# Altium footprint library mastermind.PCBLIB: 1061 footprints (part 57 of 67)
Each footprint in its own frame and in the unit in brackets; x right, y up, seen from the top. Pads: shape width x height; smd on the part's side, far side on the other; paste and mask are expansions set on the pad; w line width, h text height; cw(c..) or ccw(c..) is an arc to the next point about the centre after c.
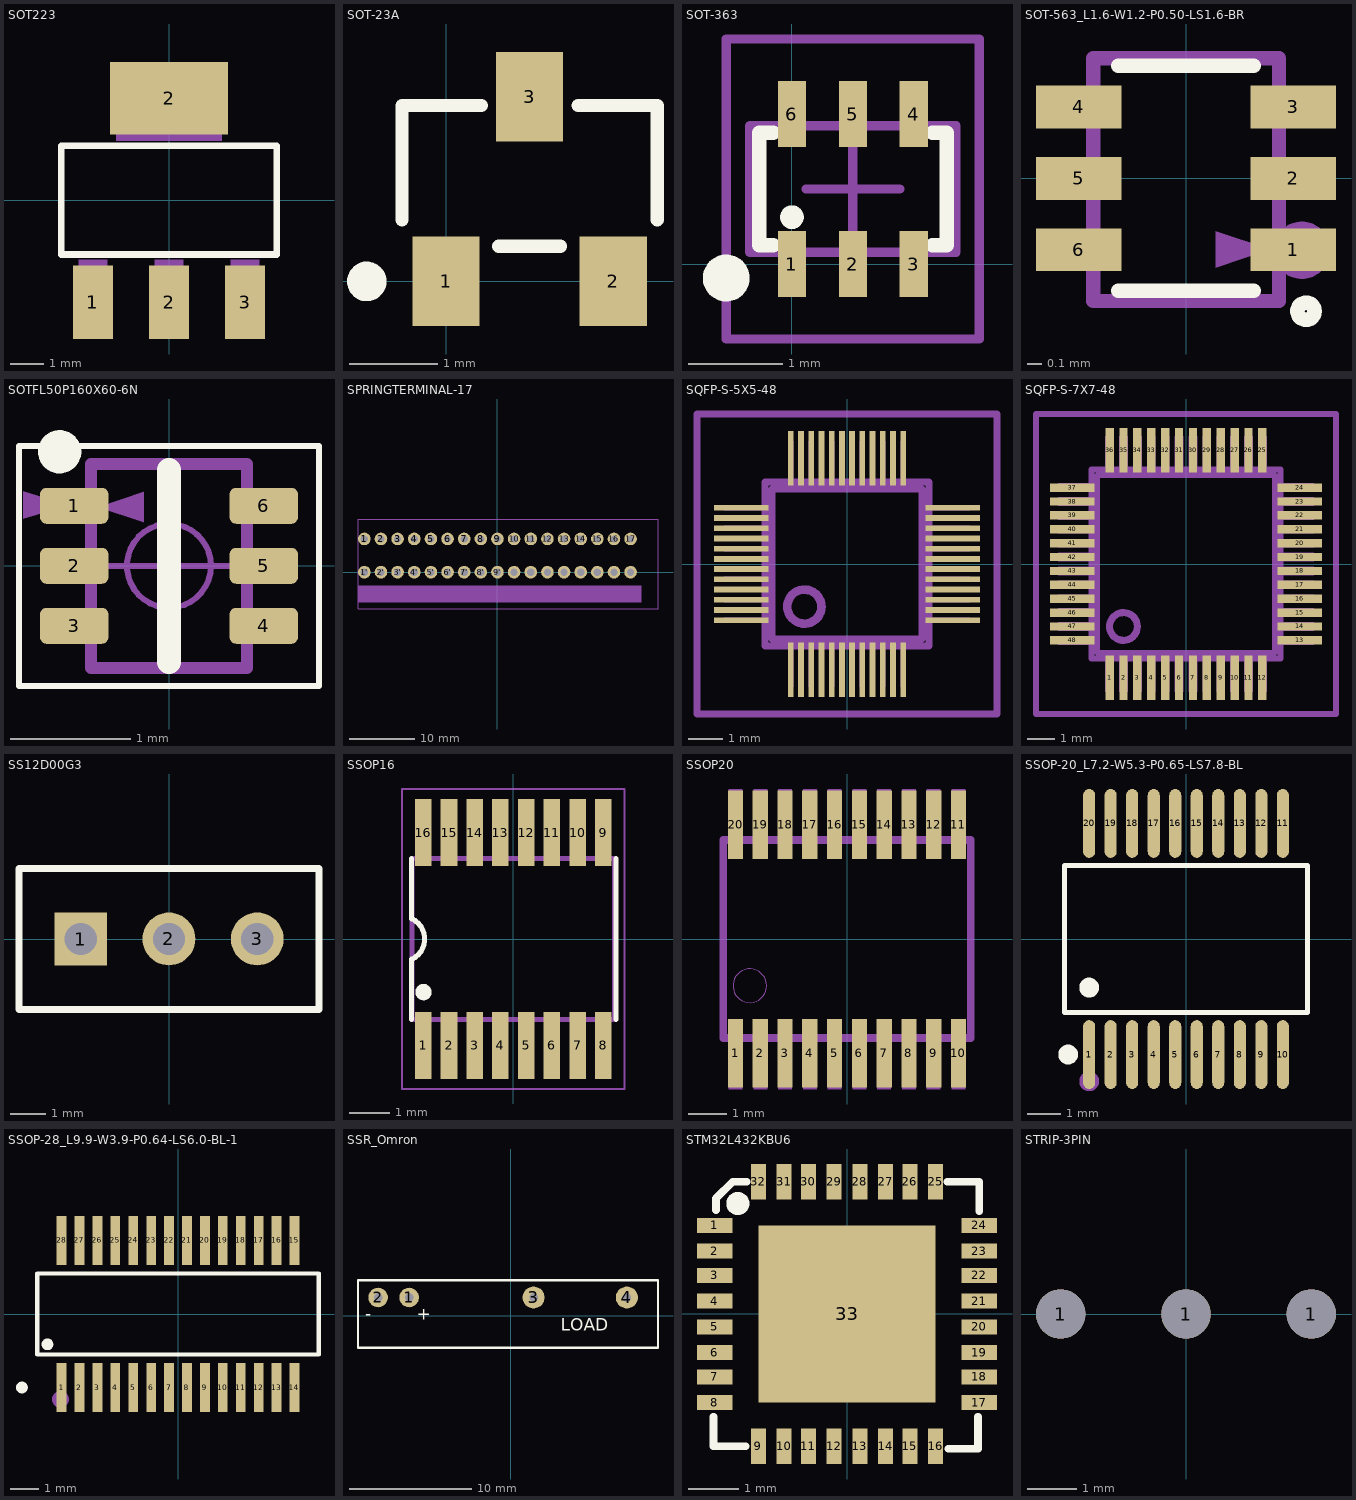
[diagram p56: the footprints below, top view; thin cyan lines are the x and y axes]

## SOT223 [mil]
pads (4):
  rect 48x88 smd: 1(-91,-122) 2(0,-122) 3(91,-122)
  rect 141.73x86.61 smd: 2(0,122.01)
Top Overlay:
  lines w8: -129,-65 -129,65 129,65 129,-65 -129,-65
Mechanical 8:
  region: 74,-144 74,-71 108,-71 108,-144
  region: -108,-144 -108,-71 -74,-71 -74,-144
  region: -17,-144 -17,-71 17,-71 17,-144
  region: -63,71 -63,144 63,144 63,71
  region: 74,-144 74,-71 108,-71 108,-144
  region: -108,-144 -108,-71 -74,-71 -74,-144
  region: -17,-144 -17,-71 17,-71 17,-144
  region: -63,71 -63,144 63,144 63,71
3D body "User Library-AMS1117.STEP": height 72.83, standoff -0.39, extent -127.95,-136 127.96,139.56

## SOT-23A [mil]
pads (3):
  rect 30x40 smd: 1(0,0) 2(74.8,0) 3(37.4,82.68)
Top Overlay:
  circle w9.84: c-35.43,0 r3.94
  lines w5.91: -19.68,27.56 -19.68,78.74 15.75,78.74 ; 23.62,15.75 51.18,15.75 ; 59.06,78.74 94.49,78.74 94.49,27.56
3D body "User Library-sot23-1.step": height 39.37, standoff 0, extent -20.07,-4.72 94.89,87.41

## SOT-363 [mm]
pads (6):
  rect 0.3x0.7 smd: 1(0,0) 2(0.65,0) 3(1.3,0) 4(1.3,1.6) 5(0.65,1.6) 6(0,1.6)
Top Overlay:
  circle w0.152: c0,0.5 r0.05
  circle w0.25: c-0.7,-0.15 r0.125
  lines w0.152: -0.2,0.2 -0.35,0.2 -0.35,1.4 -0.2,1.4 ; 1.5,0.2 1.65,0.2 1.65,1.4 1.5,1.4
Mechanical 13:
  lines w0.1: -0.45,0.125 1.75,0.125 1.75,1.475 -0.45,1.475 -0.45,0.125
Mechanical 15:
  lines w0.1: 0.15,0.8 1.15,0.8 ; 0.65,0.3 0.65,1.3 ; -0.7,-0.8 2,-0.8 2,2.4 -0.7,2.4 -0.7,-0.8
3D body "User Library-SC70-6.step": height 0.93, standoff -0.02, extent -0.35,-0.25 1.65,1.85

## SOT-563_L1.6-W1.2-P0.50-LS1.6-BR [mm]
pads (6):
  rect 0.6x0.3 smd paste+0 mask+0.051: 1(0.75,-0.5) 2(0.75,0) 3(0.75,0.5) 4(-0.75,0.5) 5(-0.75,0) 6(-0.75,-0.5)
Top Overlay:
  circle w0.102: c0.84,-0.93 r0.06
  lines w0.1: -0.475,-0.787 0.475,-0.787 ; -0.475,0.787 0.475,0.787
Mechanical 15:
  circle w0.2: c0.81,-0.503 r0.1
Top Dimensions:
  region: 0.591,-0.498 0.21,-0.625 0.21,-0.371
  lines w0.1: -0.65,-0.859 0.65,-0.859 0.65,0.841 -0.65,0.841 -0.65,-0.859
3D body "User Library-SOT-563.STEP": height 0.58, standoff 0, extent -0.825,-0.802 0.8,0.798

## SOTFL50P160X60-6N [mm]
pads (6):
  rrect35% 0.57x0.3 smd: 1(-0.79,0.5) 2(-0.79,0) 3(-0.79,-0.5) 4(0.79,-0.5) 5(0.79,0) 6(0.79,0.5)
Top Overlay:
  circle w0.2: c-0.911,0.95 r0.08
  lines w0.05: -1.25,-1 1.25,-1 1.25,1 -1.25,1 -1.25,-1
  lines w0.2: 0,-0.8 0,0.8
Top Component Center:
  circle w0.05: c0,0 r0.35
  lines w0.05: -0.5,0 0.5,0 ; 0,-0.5 0,0.5
Top 3D Body:
  lines w0.001: -0.65,-0.85 0.65,-0.85 0.65,0.85 -0.65,0.85 -0.65,-0.85
Top Dimensions:
  region: -0.59,0.489 -0.209,0.616 -0.209,0.362
  lines w0.1: -0.65,-0.85 0.65,-0.85 0.65,0.85 -0.65,0.85 -0.65,-0.85
Top Assembly:
  text ".Designator" at -1.4,1.35 h0.75
Top Component Outline:
  region: -1.214,0.393 -0.836,0.507 -1.214,0.62
3D body "User Library-SOT-563.STEP": height 0.58, standoff 0, extent -0.813,-0.8 0.813,0.8

## SPRINGTERMINAL-17 [mil]
pads (34):
  round 76 hole 43.31: 1(-800,200) 1'(-800,0) 2(-700,200) 2'(-700,0) 3(-600,200) 3'(-600,0) 4(-500,200) 4'(-500,0) 5(-400,200) 5'(-400,0) 6(-300,200) 6'(-300,0) 7(-200,200) 7'(-200,0) 8(-100,200) 8'(-100,0) 9(0,200) 9'(0,0) 10(100,200) 10'(100,0) 11(200,200) 11'(200,0) 12(300,200) 12'(300,0) 13(400,200) 13'(400,0) 14(500,200) 14'(500,0) 15(600,200) 15'(600,0) 16(700,200) 16'(700,0) 17(800,200) 17'(800,0)
Mechanical 2:
  region: -835.43,-181.1 -835.43,-81.1 864.57,-81.1 864.57,-181.1
  lines w5: -835.43,-220.47 -835.43,318.9 964.57,318.9 964.57,-220.47 -835.43,-220.47

## SQFP-S-5X5-48 [mm]
pads (48):
  rect 0.17x1.6 smd: 1(-1.65,-3.1) 2(-1.35,-3.1) 3(-1.05,-3.1) 4(-0.75,-3.1) 5(-0.45,-3.1) 6(-0.15,-3.1) 7(0.15,-3.1) 8(0.45,-3.1) 9(0.75,-3.1) 10(1.05,-3.1) 11(1.35,-3.1) 12(1.65,-3.1) 25(1.65,3.1) 26(1.35,3.1) 27(1.05,3.1) 28(0.75,3.1) 29(0.45,3.1) 30(0.15,3.1) 31(-0.15,3.1) 32(-0.45,3.1) 33(-0.75,3.1) 34(-1.05,3.1) 35(-1.35,3.1) 36(-1.65,3.1)
  rect 1.6x0.17 smd: 13(3.1,-1.65) 14(3.1,-1.35) 15(3.1,-1.05) 16(3.1,-0.75) 17(3.1,-0.45) 18(3.1,-0.15) 19(3.1,0.15) 20(3.1,0.45) 21(3.1,0.75) 22(3.1,1.05) 23(3.1,1.35) 24(3.1,1.65) 37(-3.1,1.65) 38(-3.1,1.35) 39(-3.1,1.05) 40(-3.1,0.75) 41(-3.1,0.45) 42(-3.1,0.15) 43(-3.1,-0.15) 44(-3.1,-0.45) 45(-3.1,-0.75) 46(-3.1,-1.05) 47(-3.1,-1.35) 48(-3.1,-1.65)
Mechanical 2:
  circle w0.254: c-1.25,-1.25 r0.5
  lines w0.203: -2.2,-2.2 -2.2,2.2 2.2,2.2 2.2,-2.2 -2.2,-2.2
Mechanical 8:
  drawing of 52 lines, arcs and shapes, not listed
Mechanical 29 (Mech34):
  lines w0.2: -4.4,-4.4 4.4,-4.4 4.4,4.4 -4.4,4.4 -4.4,-4.4

## SQFP-S-7X7-48 [mm]
pads (48):
  rect 0.3x1.6 smd: 1(-2.75,-4.1) 2(-2.25,-4.1) 3(-1.75,-4.1) 4(-1.25,-4.1) 5(-0.75,-4.1) 6(-0.25,-4.1) 7(0.25,-4.1) 8(0.75,-4.1) 9(1.25,-4.1) 10(1.75,-4.1) 11(2.25,-4.1) 12(2.75,-4.1) 25(2.75,4.1) 26(2.25,4.1) 27(1.75,4.1) 28(1.25,4.1) 29(0.75,4.1) 30(0.25,4.1) 31(-0.25,4.1) 32(-0.75,4.1) 33(-1.25,4.1) 34(-1.75,4.1) 35(-2.25,4.1) 36(-2.75,4.1)
  rect 1.6x0.3 smd: 13(4.1,-2.75) 14(4.1,-2.25) 15(4.1,-1.75) 16(4.1,-1.25) 17(4.1,-0.75) 18(4.1,-0.25) 19(4.1,0.25) 20(4.1,0.75) 21(4.1,1.25) 22(4.1,1.75) 23(4.1,2.25) 24(4.1,2.75) 37(-4.1,2.75) 38(-4.1,2.25) 39(-4.1,1.75) 40(-4.1,1.25) 41(-4.1,0.75) 42(-4.1,0.25) 43(-4.1,-0.25) 44(-4.1,-0.75) 45(-4.1,-1.25) 46(-4.1,-1.75) 47(-4.1,-2.25) 48(-4.1,-2.75)
Mechanical 2:
  circle w0.254: c-2.25,-2.25 r0.5
  lines w0.203: -3.2,-3.2 -3.2,3.2 3.2,3.2 3.2,-3.2 -3.2,-3.2
Mechanical 8:
  drawing of 52 lines, arcs and shapes, not listed
Mechanical 29 (Mech34):
  lines w0.2: -5.4,-5.4 5.4,-5.4 5.4,5.4 -5.4,5.4 -5.4,-5.4

## SS12D00G3 [mil]
pads (3):
  rect 59x59 hole 36: 1(-98.42,-0.01)
  round 59 hole 36: 2(-0.04,0.04) 3(98.46,0.04)
Top Overlay:
  lines w7.9: -167.32,-78.75 167.32,-78.75 167.32,78.75 -167.32,78.75 -167.32,-78.75
3D body "SS12D00G3 Switch.STEP": height 273.62, standoff -143.7, extent -167.32,-72.83 167.32,72.83

## SSOP16 [mm]
pads (16):
  rect 0.41x1.65 smd: 1(-2.222,-2.63) 2(-1.587,-2.63) 3(-0.953,-2.63) 4(-0.318,-2.63) 5(0.318,-2.63) 6(0.953,-2.63) 7(1.587,-2.63) 8(2.222,-2.63) 9(2.222,2.63) 10(1.587,2.63) 11(0.953,2.63) 12(0.318,2.63) 13(-0.318,2.63) 14(-0.953,2.63) 15(-1.587,2.63) 16(-2.222,2.63)
Top Overlay:
  circle w0.203: c-2.219,-1.312 r0.1
  lines w0.127: -2.512,-1.99 -2.512,-0.497 ; -2.512,0.497 -2.512,1.99 ; -2.5,-0.5 ccw(c-2.75,0) -2.5,0.5 ; 2.538,-1.99 2.538,1.99
Mechanical 13:
  lines w0.127: -2.5,-1.99 -2.5,1.99 2.5,1.99 2.5,-1.99 -2.5,-1.99
Mechanical 15:
  lines w0.05: -2.75,-3.705 -2.75,3.705 2.75,3.705 2.75,-3.705 -2.75,-3.705
3D body "step_temp.STEP": height 1.75, standoff 0, extent -2.451,-2.997 2.451,2.997

## SSOP20 [mm]
pads (20):
  rect 0.4x1.8 smd: 1(-2.925,-3) 2(-2.275,-3) 3(-1.625,-3) 4(-0.975,-3) 5(-0.325,-3) 6(0.325,-3) 7(0.975,-3) 8(1.625,-3) 9(2.275,-3) 10(2.925,-3) 11(2.925,3) 12(2.275,3) 13(1.625,3) 14(0.975,3) 15(0.325,3) 16(-0.325,3) 17(-0.975,3) 18(-1.625,3) 19(-2.275,3) 20(-2.925,3)
Mechanical 2:
  circle w0: c-2.55,-1.225 r0.442
  lines w0.203: -3.25,-2.6 -3.25,2.6 3.25,2.6 3.25,-2.6 -3.25,-2.6
Mechanical 8:
  region: -3.103,2.642 -3.103,3.937 -2.747,3.937 -2.747,2.642
  region: -2.453,2.642 -2.453,3.937 -2.097,3.937 -2.097,2.642
  region: -1.803,2.642 -1.803,3.937 -1.447,3.937 -1.447,2.642
  region: -1.153,2.642 -1.153,3.937 -0.797,3.937 -0.797,2.642
  region: -0.503,2.642 -0.503,3.937 -0.147,3.937 -0.147,2.642
  region: 0.147,2.642 0.147,3.937 0.503,3.937 0.503,2.642
  region: 0.797,2.642 0.797,3.937 1.153,3.937 1.153,2.642
  region: 1.447,2.642 1.447,3.937 1.803,3.937 1.803,2.642
  region: 2.097,2.642 2.097,3.937 2.453,3.937 2.453,2.642
  region: 2.747,2.642 2.747,3.937 3.103,3.937 3.103,2.642
  region: 2.747,-3.937 2.747,-2.642 3.103,-2.642 3.103,-3.937
  region: 2.097,-3.937 2.097,-2.642 2.453,-2.642 2.453,-3.937
  region: 1.447,-3.937 1.447,-2.642 1.803,-2.642 1.803,-3.937
  region: 0.797,-3.937 0.797,-2.642 1.153,-2.642 1.153,-3.937
  region: 0.147,-3.937 0.147,-2.642 0.503,-2.642 0.503,-3.937
  region: -0.503,-3.937 -0.503,-2.642 -0.147,-2.642 -0.147,-3.937
  region: -1.153,-3.937 -1.153,-2.642 -0.797,-2.642 -0.797,-3.937
  region: -1.803,-3.937 -1.803,-2.642 -1.447,-2.642 -1.447,-3.937
  region: -2.453,-3.937 -2.453,-2.642 -2.097,-2.642 -2.097,-3.937
  region: -3.103,-3.937 -3.103,-2.642 -2.747,-2.642 -2.747,-3.937

## SSOP-20_L7.2-W5.3-P0.65-LS7.8-BL [mm]
pads (20):
  oval 0.364x2.082 smd: 1(-2.925,-3.491) 2(-2.275,-3.491) 3(-1.625,-3.491) 4(-0.975,-3.491) 5(-0.325,-3.491) 6(0.325,-3.491) 7(0.975,-3.491) 8(1.625,-3.491) 9(2.275,-3.491) 10(2.925,-3.491) 11(2.925,3.491) 12(2.275,3.491) 13(1.625,3.491) 14(0.975,3.491) 15(0.325,3.491) 16(-0.325,3.491) 17(-0.975,3.491) 18(-1.625,3.491) 19(-2.275,3.491) 20(-2.925,3.491)
Top Overlay:
  circle w0.3: c-3.559,-3.491 r0.15
  circle w0.3: c-2.925,-1.469 r0.15
  lines w0.152: -3.676,-2.221 3.676,-2.221 3.676,2.221 -3.676,2.221 -3.676,-2.221
Mechanical 15:
  circle w0.3: c-2.925,-4.3 r0.15
3D body: height 0.8, standoff 0, extent -3.676,-2.221 3.676,2.221

## SSOP-28_L9.9-W3.9-P0.64-LS6.0-BL-1 [mm]
pads (28):
  rect 0.35x1.751 smd paste+0 mask+0.051: 1(-4.16,-2.625) 2(-3.52,-2.625) 3(-2.88,-2.625) 4(-2.24,-2.625) 5(-1.6,-2.625) 6(-0.96,-2.625) 7(-0.32,-2.625) 8(0.32,-2.625) 9(0.96,-2.625) 10(1.6,-2.625) 11(2.24,-2.625) 12(2.88,-2.625) 13(3.52,-2.625) 14(4.16,-2.625) 15(4.16,2.625) 16(3.52,2.625) 17(2.88,2.625) 18(2.24,2.625) 19(1.6,2.625) 20(0.96,2.625) 21(0.32,2.625) 22(-0.32,2.625) 23(-0.96,2.625) 24(-1.6,2.625) 25(-2.24,2.625) 26(-2.88,2.625) 27(-3.52,2.625) 28(-4.16,2.625)
Top Overlay:
  circle w0.209: c-4.665,-1.084 r0.104
  circle w0.209: c-5.576,-2.626 r0.104
  lines w0.152: -5.026,-1.445 -5.026,1.445 5.026,1.445 5.026,-1.445 -5.026,-1.445
Mechanical 15:
  circle w0.3: c-4.2,-3.05 r0.15
3D body "Unnamed-PCBModel.step": height 1.6, standoff 0, extent -4.895,-2.99 5.005,3.01

## SSR_Omron [mm]
pads (4):
  round 1.6 hole 0.7: 1(-8.306,1.473) 2(-10.846,1.473)
  round 1.8 hole 0.7: 3(1.854,1.473) 4(9.474,1.473)
Top Overlay:
  lines w0.2: -12.486,-2.627 -12.486,2.873 12.014,2.873 12.014,-2.627 -12.486,-2.627
  text "LOAD" at 4.089,-1.245 h1
  text "-" at -11.887,-0.33 h1
  text "+" at -7.696,-0.33 h1

## STM32L432KBU6 [mil]
pads (33):
  rect 27.6x11.8 smd mask+2.76: 1(-103,69) 2(-103,49) 3(-103,30) 4(-103,10) 5(-103,-10) 6(-103,-30) 7(-103,-49) 8(-103,-69) 17(103,-69) 18(103,-49) 19(103,-30) 20(103,-10) 21(103,10) 22(103,30) 23(103,49) 24(103,69)
  rect 11.8x27.6 smd mask+2.76: 9(-69,-103) 10(-49,-103) 11(-30,-103) 12(-10,-103) 13(10,-103) 14(30,-103) 15(49,-103) 16(69,-103) 25(69,103) 26(49,103) 27(30,103) 28(10,103) 29(-10,103) 30(-30,103) 31(-49,103) 32(-69,103)
  rect 137.8x137.8 smd: 33(0,0)
Top Overlay:
  circle w10: c-85,86 r4
  lines w6.06: -104,-80 -104,-103 -79,-103 ; -102,81 -102,90 -89,103 -78,103 ; 78,103 103,103 103,80 ; 79,-105 102,-105 102,-80
Mechanical 15:
  lines w6.06: -1,-1 1,1

## STRIP-3PIN [mm]
pads (3):
  round 1 hole 1: 1(-2.54,0) 1(0,0) 1(2.54,0)
Top Layer:
  region: 0,0 0.254,0 0.254,0.254 0,0.254